# Altium footprint library mastermind.PCBLIB: 1061 footprints (part 55 of 67)
Each footprint in its own frame and in the unit in brackets; x right, y up, seen from the top. Pads: shape width x height; smd on the part's side, far side on the other; paste and mask are expansions set on the pad; w line width, h text height; cw(c..) or ccw(c..) is an arc to the next point about the centre after c.
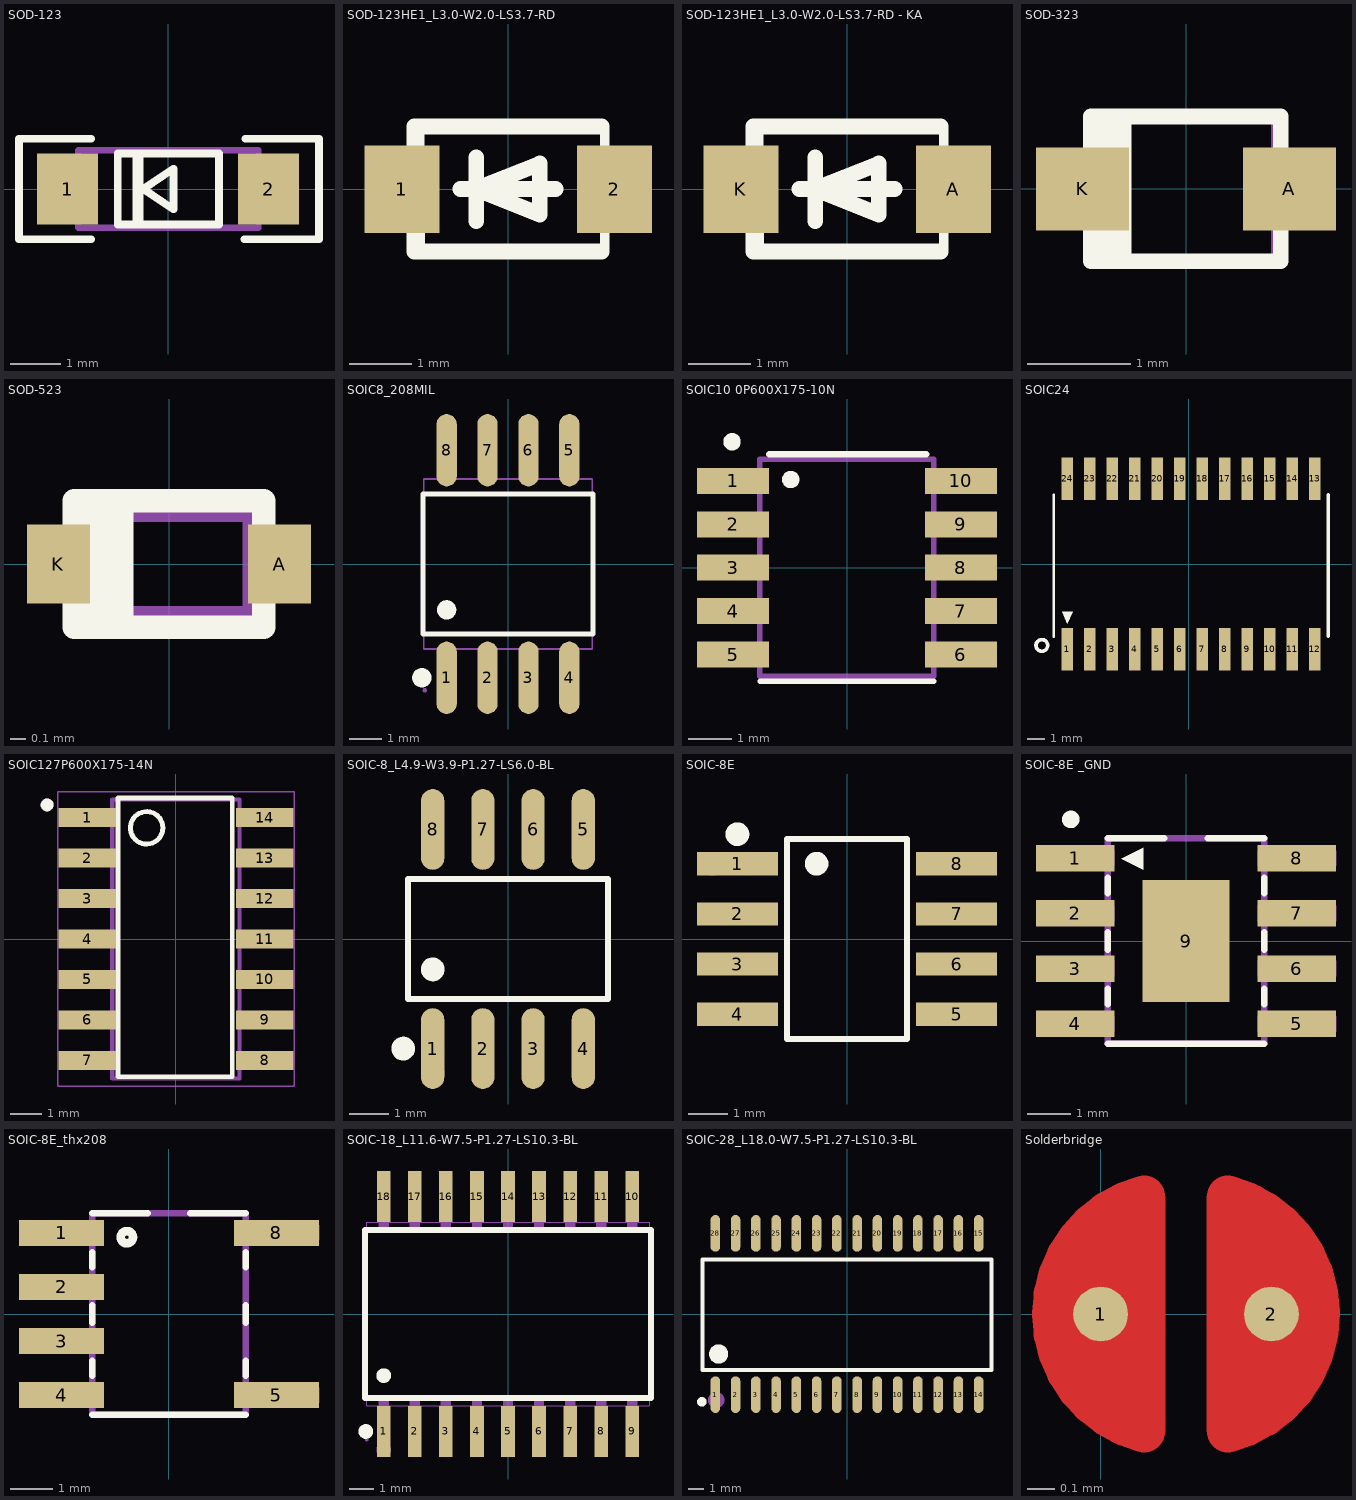
[diagram p54: the footprints below, top view; thin cyan lines are the x and y axes]

## SOD-123 [mm]
pads (2):
  rect 1.2x1.4 smd: 1(-1.99,0) 2(1.977,0)
Top Overlay:
  region: -0.7,-0.7 -0.7,0.7 -0.5,0.7 -0.5,-0.7
  lines w0.152: -1,-0.7 1,-0.7 1,0.7 -1,0.7 -1,-0.7 ; -0.5,0 0.1,0.4 0.1,-0.4 -0.5,0
  lines w0.154: -1.524,-0.991 -2.946,-0.991 -2.946,0.991 -1.524,0.991 ; 1.499,-0.991 2.972,-0.991 2.972,0.991 1.524,0.991
Mechanical 2:
  lines w0.127: -1.778,-0.762 1.778,-0.762 1.778,0.762 -1.778,0.762 -1.778,-0.762
3D body "User Library-SOD123-1.step": height 1.18, standoff 0, extent -1.95,-0.9 1.95,0.9

## SOD-123HE1_L3.0-W2.0-LS3.7-RD [mm]
pads (2):
  rect 1.2x1.4 smd: 1(-1.7,0) 2(1.7,0)
Top Overlay:
  lines w0.152: -1.55,-1 -1.55,-0.7 -1.406,-0.7 ; -1.545,1 -1.545,0.7 -1.409,0.7 ; -1.488,1 -1.5,1 -1.485,1 ; -1.409,0.702 -1.409,1.002 ; -1.406,-0.996 -1.406,-0.696 ; 1.5,1 1.507,1 ; 1.547,0.702 1.547,1 ; 1.55,-1 1.55,-0.702
  lines w0.254: -1.5,-1 1.5,-1 ; -1.5,1 1.5,1 ; -0.762,0 0.762,0 ; -0.508,-0.508 -0.508,0.508 ; -0.508,0 0.508,-0.406 0.508,0.406 -0.508,0
3D body "User Library-SOD123-1.step": height 1.18, standoff 0, extent -1.907,-0.875 1.993,0.925

## SOD-123HE1_L3.0-W2.0-LS3.7-RD - KA [mm]
pads (2):
  rect 1.2x1.4 smd: A(1.7,0) K(-1.7,0)
Top Overlay:
  lines w0.152: -1.55,-1 -1.55,-0.7 -1.406,-0.7 ; -1.545,1 -1.545,0.7 -1.409,0.7 ; -1.488,1 -1.5,1 -1.485,1 ; -1.409,0.702 -1.409,1.002 ; -1.406,-0.996 -1.406,-0.696 ; 1.5,1 1.507,1 ; 1.547,0.702 1.547,1 ; 1.55,-1 1.55,-0.702
  lines w0.254: -1.5,-1 1.5,-1 ; -1.5,1 1.5,1 ; -0.762,0 0.762,0 ; -0.508,-0.508 -0.508,0.508 ; -0.508,0 0.508,0.406 0.508,-0.406 -0.508,0
3D body "User Library-SOD123-1.step": height 1.18, standoff 0, extent -1.907,-0.875 1.993,0.925

## SOD-323 [mm]
pads (2):
  rect 0.9x0.8 smd: A(1,0) K(-1,0)
Top Overlay:
  region: -0.874,-0.688 -0.874,0.712 -0.674,0.712 -0.674,-0.688
  lines w0.15: -0.602,-0.7 -0.602,0.659
  lines w0.152: -0.92,-0.7 -0.92,0.7 0.916,0.7 0.916,-0.7 -0.92,-0.7
Dimensions:
  lines w0.1: -0.92,-0.311 -0.92,0.23 ; -0.888,0.7 0.916,0.7 0.916,-0.714 -0.92,-0.714 -0.92,0.7 0.9,0.7 0.873,0.673 0.872,0.23 0.872,-0.556 ; 0.872,-0.163 0.873,-0.661 0.912,-0.7
  text ".Designator" at 1.753,0.158 h0.3
3D body "SOD-323.STEP": height 1.17, standoff 0.02, extent -1.352,-0.714 1.348,0.732

## SOD-523 [mm]
height 0.7
pads (2):
  rect 0.4x0.5 smd: A(0.7,0) K(-0.7,0)
Top Overlay:
  lines w0.15: -0.5,-0.4 -0.5,0.4 ; -0.4,-0.4 -0.4,0.4 ; -0.3,-0.4 -0.3,0.4 ; -0.6,-0.4 0.6,-0.4 0.6,0.4 -0.6,0.4 -0.6,-0.4
Dimensions:
  lines w0.1: -0.593,-0.147 -0.791,-0.147 -0.791,0.147 -0.593,0.147 ; 0.593,-0.147 0.791,-0.147 0.791,0.147 0.593,0.147 ; -0.593,-0.393 -0.516,-0.317 ; -0.593,-0.393 -0.593,0.393 ; -0.593,-0.393 0.593,-0.393 ; -0.593,0.393 -0.516,0.317 ; -0.593,0.393 0.593,0.393 ; -0.516,-0.317 0.517,-0.317 ; -0.516,-0.317 -0.516,0.317 ; -0.516,0.317 0.517,0.317 ; 0.517,-0.317 0.593,-0.393 ; 0.517,-0.317 0.517,0.317 ; 0.517,0.317 0.593,0.393 ; 0.593,-0.393 0.593,0.393
  text ".Designator" at 1.749,0.152 h0.3
3D body "User Library-SOD-523F.step": height 0.7, standoff 0, extent -0.8,-0.399 0.8,0.399

## SOIC8_208MIL [mm]
pads (8):
  oval 0.63x2.25 smd paste+0 mask+0.051: 1(-1.905,-3.53) 2(-0.635,-3.53) 3(0.635,-3.53) 4(1.905,-3.53) 5(1.905,3.53) 6(0.635,3.53) 7(-0.635,3.53) 8(-1.905,3.53)
Top Overlay:
  circle w0.3: c-1.905,-1.424 r0.15
  circle w0.3: c-2.672,-3.53 r0.15
  lines w0.152: -2.639,-2.176 -2.639,2.176 2.639,2.176 2.639,-2.176 -2.639,-2.176
Mechanical 6:
  circle w0.3: c-1.905,-4.35 r0.15
Mechanical 15:
  region: -2.525,-3.92 -2.525,-3.895 -2.56,-3.86 -2.61,-3.86 -2.645,-3.895 -2.645,-3.92 -2.645,-3.945 -2.61,-3.98 -2.56,-3.98 -2.525,-3.945 -2.525,-3.92
  region: -2.13,-3.95 -2.13,-3.3 -1.68,-3.3 -1.68,-3.95
  region: -2.13,-3.31 -2.13,-2.595 -1.68,-2.595 -1.68,-3.31
  region: -0.86,-3.95 -0.86,-3.3 -0.41,-3.3 -0.41,-3.95
  region: -0.86,-3.31 -0.86,-2.595 -0.41,-2.595 -0.41,-3.31
  region: 0.41,-3.95 0.41,-3.3 0.86,-3.3 0.86,-3.95
  region: 0.41,-3.31 0.41,-2.595 0.86,-2.595 0.86,-3.31
  region: 1.68,-3.95 1.68,-3.3 2.13,-3.3 2.13,-3.95
  region: 1.68,-3.31 1.68,-2.595 2.13,-2.595 2.13,-3.31
  region: -2.13,3.95 -2.13,3.3 -1.68,3.3 -1.68,3.95
  region: -2.13,3.31 -2.13,2.595 -1.68,2.595 -1.68,3.31
  region: -0.86,3.95 -0.86,3.3 -0.41,3.3 -0.41,3.95
  region: -0.86,3.31 -0.86,2.595 -0.41,2.595 -0.41,3.31
  region: 0.41,3.95 0.41,3.3 0.86,3.3 0.86,3.95
  region: 0.41,3.31 0.41,2.595 0.86,2.595 0.86,3.31
  region: 1.68,3.95 1.68,3.3 2.13,3.3 2.13,3.95
  region: 1.68,3.31 1.68,2.595 2.13,2.595 2.13,3.31
  lines w0.051: -2.615,-2.64 -2.615,2.64 2.615,2.64 2.615,-2.64 -2.615,-2.64
3D body "AT TINY MICROCONTROLLER.STEP": height 1.75, standoff 0, extent -2.436,-2.918 2.464,3.082

## SOIC10 0P600X175-10N [mm]
pads (10):
  rect 1.66x0.6 smd: 1(-2.625,2) 2(-2.625,1) 3(-2.625,0) 4(-2.625,-1) 5(-2.625,-2) 6(2.625,-2) 7(2.625,-1) 8(2.625,0) 9(2.625,1) 10(2.625,2)
Top Overlay:
  circle w0.2: c-1.295,2.031 r0.1
  circle w0.2: c-2.648,2.9 r0.1
  lines w0.127: -2,-2.614 2,-2.614
  lines w0.152: -1.786,2.609 -0.48,2.609 0.514,2.609 1.82,2.609
Mechanical 13:
  lines w0.127: -2.005,-2.503 1.995,-2.503 1.995,2.497 -2.005,2.497 -2.005,-2.503
3D body "CN3767.stp": height 1.75, standoff 0, extent -2.98,-2.47 3.02,2.43

## SOIC24 [mil] "SOIC, 8-Leads, Body 4.90x3.90mm, Pitch 1.27mm, IPC Medium Density"
height 68.9
pads (24):
  rect 26x94.49 smd: 1(-270,-189.49) 2(-220,-189.49) 3(-170,-189.49) 4(-120,-189.49) 5(-70,-189.49) 6(-20,-189.49) 7(30,-189.49) 8(80,-189.49) 9(130,-189.49) 10(180,-189.49) 11(230,-189.49) 12(280,-189.49) 13(280,189.5) 14(230,189.5) 15(180,189.5) 16(130,189.5) 17(80,189.5) 18(30,189.5) 19(-20,189.5) 20(-70,189.5) 21(-120,189.5) 22(-170,189.5) 23(-220,189.5) 24(-270,189.5)
Top Overlay:
  circle w8: c-326.77,-181 r12.99
  region: -281.83,-106.3 -258.17,-106.3 -270.49,-132.92
  lines w5.98: -300,-161.44 -300,-81.73 -300,-31.44 -300,69.98 -300,153.52
  lines w7.87: 310,-160.5 310,154.46
Mechanical 13:
  drawing of 48 lines, arcs and shapes, not listed
3D body "User Library-SOIC_24-300.STEP": height 102.36, standoff 0, extent -296.15,-201.45 310.15,208

## SOIC127P600X175-14N [mm]
height 1.75
pads (14):
  rect 1.8x0.6 smd: 1(-2.785,3.81) 2(-2.785,2.54) 3(-2.785,1.27) 4(-2.785,0) 5(-2.785,-1.27) 6(-2.785,-2.54) 7(-2.785,-3.81) 8(2.785,-3.81) 9(2.785,-2.54) 10(2.785,-1.27) 11(2.785,0) 12(2.785,1.27) 13(2.785,2.54) 14(2.785,3.81)
Top Overlay:
  circle w0.2: c-4.045,4.21 r0.1
  circle w0.152: c-0.92,3.49 r0.51
  lines w0.152: -1.814,-4.325 -1.814,4.432 1.767,4.432 1.767,-4.325 -1.814,-4.325
Mechanical 13:
  circle w0.2: c-4.045,4.21 r0.1
  lines w0.127: -2,-4.375 2,-4.375 2,4.375 -2,4.375 -2,-4.375
Mechanical 15:
  lines w0.05: -3.71,-4.625 3.71,-4.625 3.71,4.625 -3.71,4.625 -3.71,-4.625
3D body "step_temp.STEP": height 1.75, standoff 0, extent -3,-4.325 3,4.325

## SOIC-8_L4.9-W3.9-P1.27-LS6.0-BL [mm]
pads (8):
  oval 0.588x2.045 smd paste+0 mask+0.051: 1(-1.905,-2.773) 2(-0.635,-2.773) 3(0.635,-2.773) 4(1.905,-2.773) 5(1.905,2.773) 6(0.635,2.773) 7(-0.635,2.773) 8(-1.905,2.773)
Top Overlay:
  circle w0.3: c-2.652,-2.772 r0.15
  circle w0.3: c-1.905,-0.769 r0.15
  lines w0.152: -2.526,-1.521 2.526,-1.521 2.526,1.521 -2.526,1.521 -2.526,-1.521
Mechanical 15:
  circle w0.3: c-1.905,-3.4 r0.15
3D body "SOIC-8E.step": height 1.75, standoff 0, extent -2.5,-3 2.5,3

## SOIC-8E [mm] "SOIC, 8-Leads, Body 4.90x3.90mm, Pitch 1.27mm, IPC Medium Density"
height 1.75
pads (8):
  rect 2.045x0.588 smd paste+0 mask+0.051: 1(-2.773,1.905) 2(-2.773,0.635) 3(-2.773,-0.635) 4(-2.773,-1.905) 5(2.773,-1.905) 6(2.773,-0.635) 7(2.773,0.635) 8(2.773,1.905)
Top Overlay:
  circle w0.3: c-0.769,1.905 r0.15
  circle w0.3: c-2.772,2.652 r0.15
  lines w0.152: -1.521,-2.526 1.521,-2.526 1.521,2.526 -1.521,2.526 -1.521,-2.526
Mechanical 15:
  circle w0.3: c-3.4,1.905 r0.15
3D body "SOIC-8E.step": height 1.75, standoff 0, extent -3,-2.5 3,2.5

## SOIC-8E _GND [mm] "SOIC, 8-Leads, Body 4.90x3.90mm, Pitch 1.27mm, IPC Medium Density"
height 1.75
pads (9):
  rect 1.8x0.61 smd: 1(-2.55,1.905) 2(-2.55,0.635) 3(-2.55,-0.635) 4(-2.55,-1.905) 5(2.55,-1.905) 6(2.55,-0.635) 7(2.55,0.635) 8(2.55,1.905)
  rect 2x2.8 smd: 9(0,0)
Top Overlay:
  circle w0.203: c-2.65,2.8 r0.1
  region: -0.979,1.637 -0.979,2.145 -1.487,1.891
  lines w0.152: -1.803,-2.362 1.803,-2.362 ; -1.803,2.362 -0.497,2.362 ; -1.8,-1.45 -1.8,-1.1 ; -1.8,-0.2 -1.8,0.2 ; -1.8,1.1 -1.8,1.45 ; 0.497,2.362 1.803,2.362 ; 1.8,-1.45 1.8,-1.1 ; 1.8,-0.2 1.8,0.2 ; 1.8,1.1 1.8,1.45
Mechanical 3:
  region: -3.45,2.083 -1.654,2.083 -1.654,1.727 -3.45,1.727
  region: -3.45,0.813 -1.654,0.813 -1.654,0.457 -3.45,0.457
  region: -3.45,-0.457 -1.654,-0.457 -1.654,-0.813 -3.45,-0.813
  region: -3.45,-1.727 -1.654,-1.727 -1.654,-2.083 -3.45,-2.083
  region: 1.654,2.083 3.45,2.083 3.45,1.727 1.654,1.727
  region: 1.654,0.813 3.45,0.813 3.45,0.457 1.654,0.457
  region: 1.654,-0.457 3.45,-0.457 3.45,-0.813 1.654,-0.813
  region: 1.654,-1.727 3.45,-1.727 3.45,-2.083 1.654,-2.083
  lines w0.152: -1.803,-2.362 -1.803,2.362 1.803,2.362 1.803,-2.362 -1.803,-2.362
3D body "SOIC-8E.step": height 1.75, standoff 0, extent -2.899,-2.507 3.101,2.493

## SOIC-8E_thx208 [mm] "SOIC, 8-Leads, Body 4.90x3.90mm, Pitch 1.27mm, IPC Medium Density"
height 1.75
pads (6):
  rect 2x0.61 smd: 1(-2.523,1.905) 2(-2.523,0.635) 3(-2.523,-0.635) 4(-2.523,-1.905) 5(2.523,-1.905) 8(2.523,1.905)
Top Overlay:
  circle w0.203: c-0.991,1.803 r0.144
  lines w0.152: -1.803,-2.362 1.803,-2.362 ; -1.803,2.362 -0.497,2.362 ; -1.8,-1.45 -1.8,-1.1 ; -1.8,-0.2 -1.8,0.2 ; -1.8,1.1 -1.8,1.45 ; 0.497,2.362 1.803,2.362 ; 1.8,-1.45 1.8,-1.1 ; 1.8,-0.2 1.8,0.2 ; 1.8,1.1 1.8,1.45
Mechanical 3:
  region: -3.523,2.083 -1.854,2.083 -1.854,1.727 -3.523,1.727
  region: -3.523,0.813 -1.854,0.813 -1.854,0.457 -3.523,0.457
  region: -3.523,-0.457 -1.854,-0.457 -1.854,-0.813 -3.523,-0.813
  region: -3.523,-1.727 -1.854,-1.727 -1.854,-2.083 -3.523,-2.083
  region: 1.854,2.083 3.523,2.083 3.523,1.727 1.854,1.727
  region: 1.854,-1.727 3.523,-1.727 3.523,-2.083 1.854,-2.083
  lines w0.152: -1.803,-2.362 -1.803,2.362 1.803,2.362 1.803,-2.362 -1.803,-2.362
3D body "SOIC-8E.step": height 1.75, standoff 0, extent -2.899,-2.507 3.101,2.493

## SOIC-18_L11.6-W7.5-P1.27-LS10.3-BL [mm]
pads (18):
  rect 0.56x2.1 smd paste+0 mask+0.051: 1(-5.08,-4.8) 2(-3.81,-4.8) 3(-2.54,-4.8) 4(-1.27,-4.8) 5(0,-4.8) 6(1.27,-4.8) 7(2.54,-4.8) 8(3.81,-4.8) 9(5.08,-4.8) 10(5.08,4.8) 11(3.81,4.8) 12(2.54,4.8) 13(1.27,4.8) 14(0,4.8) 15(-1.27,4.8) 16(-2.54,4.8) 17(-3.81,4.8) 18(-5.08,4.8)
Top Overlay:
  circle w0.3: c-5.812,-4.8 r0.15
  circle w0.3: c-5.08,-2.519 r0.15
  lines w0.254: -5.842,-3.429 5.842,-3.429 5.842,3.429 -5.842,3.429 -5.842,-3.429
Mechanical 6:
  circle w0.3: c-5.08,-5.55 r0.15
Mechanical 15:
  drawing of 41 lines, arcs and shapes, not listed
3D body "SOIC18 wide.stp": height 2, standoff 0, extent -5.675,-4.982 5.675,5.182

## SOIC-28_L18.0-W7.5-P1.27-LS10.3-BL [mm]
pads (28):
  oval 0.6x2.3 smd paste+0 mask+0.051: 1(-8.255,-5.058) 2(-6.985,-5.058) 3(-5.715,-5.058) 4(-4.445,-5.058) 5(-3.175,-5.058) 6(-1.905,-5.058) 7(-0.635,-5.058) 8(0.635,-5.058) 9(1.905,-5.058) 10(3.175,-5.058) 11(4.445,-5.058) 12(5.715,-5.058) 13(6.985,-5.058) 14(8.255,-5.058) 15(8.255,5.058) 16(6.985,5.058) 17(5.715,5.058) 18(4.445,5.058) 19(3.175,5.058) 20(1.905,5.058) 21(0.635,5.058) 22(-0.635,5.058) 23(-1.905,5.058) 24(-3.175,5.058) 25(-4.445,5.058) 26(-5.715,5.058) 27(-6.985,5.058) 28(-8.255,5.058)
Top Overlay:
  lines w0.254: -9.05,-3.508 9.05,-3.508 9.05,3.42 -9.05,3.42 -9.05,2.492 -9.05,-3.508
  lines w0.3: -9.101,-5.356 ccw(c-9.1,-5.506) -9.098,-5.356
  lines w0.6: -8.049,-2.207 ccw(c-8.047,-2.507) -8.044,-2.207
Mechanical 15:
  circle w0.508: c-8.2,-5.4 r0.254

## Solderbridge [mm]
pads (2):
  round 0.2 smd paste-10: 1(0,0) 2(0.625,0)
Top Layer:
  region: 0.236,-0.432 0.16,-0.505 0.042,-0.467 -0.023,-0.424 -0.097,-0.351 -0.15,-0.292 -0.208,-0.193 -0.236,-0.099 -0.231,0.122 -0.206,0.193 -0.122,0.33 -0.038,0.411 0.054,0.469 0.155,0.5 0.206,0.483 0.236,0.43
  region: 0.389,0.432 0.465,0.505 0.583,0.467 0.648,0.424 0.721,0.351 0.775,0.292 0.833,0.193 0.861,0.099 0.856,-0.122 0.831,-0.193 0.747,-0.33 0.663,-0.411 0.571,-0.469 0.47,-0.5 0.419,-0.483 0.389,-0.43
  lines w0.152: 0.159,-0.431 cw(c0.27,0) -0.175,0 cw(c0.27,0) 0.025,0.371 cw(c0.27,0) 0.159,0.431 ; 0.465,-0.431 ccw(c0.355,0) 0.774,0.149 ccw(c0.355,0) 0.465,0.431
Top Solder:
  circle w0.61: c0.31,0 r0.279